# Altium footprint library 2.54插件排母.PcbLib: 74 footprints (part 2 of 5)
Each footprint in its own frame and in the unit in brackets; x right, y up, seen from the top. Pads: shape width x height; smd on the part's side, far side on the other; paste and mask are expansions set on the pad; w line width, h text height; cw(c..) or ccw(c..) is an arc to the next point about the centre after c.
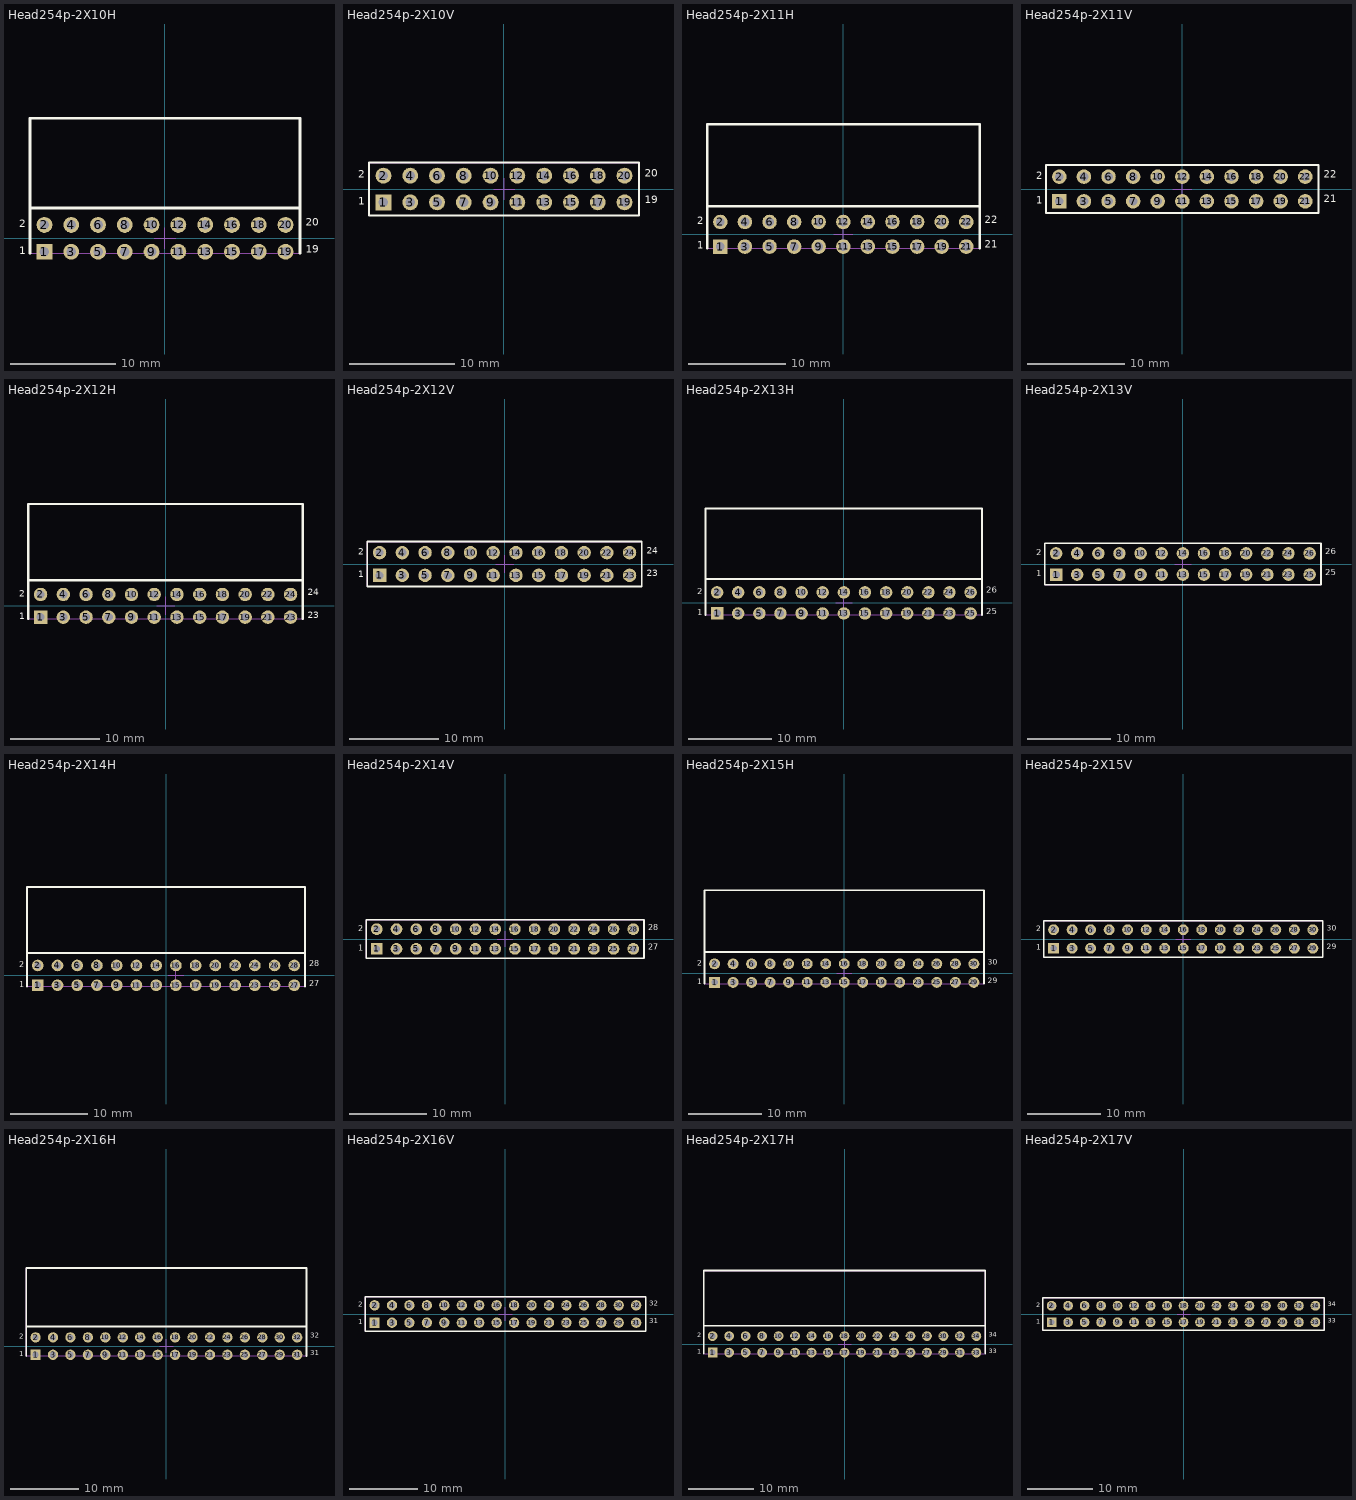
[diagram p1: the footprints below, top view; thin cyan lines are the x and y axes]

## Head254p-2X10H [mm] "2.54脚距 90度 插件 双排母"
height 5
pads (20):
  rect 1.5x1.5 hole 0.9: 1(-11.43,-1.27)
  round 1.5 hole 0.9: 2(-11.43,1.27) 3(-8.89,-1.27) 4(-8.89,1.27) 5(-6.35,-1.27) 6(-6.35,1.27) 7(-3.81,-1.27) 8(-3.81,1.27) 9(-1.27,-1.27) 10(-1.27,1.27) 11(1.27,-1.27) 12(1.27,1.27) 13(3.81,-1.27) 14(3.81,1.27) 15(6.35,-1.27) 16(6.35,1.27) 17(8.89,-1.27) 18(8.89,1.27) 19(11.43,-1.27) 20(11.43,1.27)
Top Overlay:
  lines w0.254: -12.8,-1.43 -12.8,11.37 12.8,11.37 12.8,-1.43 ; -12.8,2.87 12.8,2.87
  text "2" at -13.843,0.762 h1.27
  text "1" at -13.843,-1.778 h1.27
  text "19" at 13.335,-1.651 h1.27
  text "20" at 13.335,0.889 h1.27
Mechanical 13:
  lines w0.1: -12.8,-1.43 -12.8,11.37 12.8,11.37 12.8,-1.43 -12.8,-1.43
Mechanical 15:
  lines w0.1: -1,0 1,0 ; 0,-1 0,1
3D body: height 5.04, standoff -2.35, extent -12.8,-1.43 12.8,11.37

## Head254p-2X10V [mm] "2.54脚距 180度 插件 双排母"
height 9
pads (20):
  rect 1.5x1.5 hole 0.9: 1(-11.43,-1.27)
  round 1.5 hole 0.9: 2(-11.43,1.27) 3(-8.89,-1.27) 4(-8.89,1.27) 5(-6.35,-1.27) 6(-6.35,1.27) 7(-3.81,-1.27) 8(-3.81,1.27) 9(-1.27,-1.27) 10(-1.27,1.27) 11(1.27,-1.27) 12(1.27,1.27) 13(3.81,-1.27) 14(3.81,1.27) 15(6.35,-1.27) 16(6.35,1.27) 17(8.89,-1.27) 18(8.89,1.27) 19(11.43,-1.27) 20(11.43,1.27)
Top Overlay:
  lines w0.2: -12.8,-2.5 12.8,-2.5 12.8,2.5 -12.8,2.5 -12.8,-2.5
  text "2" at -13.843,0.762 h1.27
  text "1" at -13.843,-1.778 h1.27
  text "19" at 13.335,-1.651 h1.27
  text "20" at 13.335,0.889 h1.27
Mechanical 13:
  lines w0.1: -12.8,-2.5 -12.8,2.5 12.8,2.5 12.8,-2.5 -12.8,-2.5
Mechanical 15:
  lines w0.1: -0.973,0 1.027,0 ; 0.027,-1 0.027,1
3D body: height 8.5, standoff -3, extent -12.8,-2.5 12.8,2.5

## Head254p-2X11H [mm] "2.54脚距 90度 插件 双排母"
height 5
pads (22):
  rect 1.5x1.5 hole 0.9: 1(-12.7,-1.27)
  round 1.5 hole 0.9: 2(-12.7,1.27) 3(-10.16,-1.27) 4(-10.16,1.27) 5(-7.62,-1.27) 6(-7.62,1.27) 7(-5.08,-1.27) 8(-5.08,1.27) 9(-2.54,-1.27) 10(-2.54,1.27) 11(0,-1.27) 12(0,1.27) 13(2.54,-1.27) 14(2.54,1.27) 15(5.08,-1.27) 16(5.08,1.27) 17(7.62,-1.27) 18(7.62,1.27) 19(10.16,-1.27) 20(10.16,1.27) 21(12.7,-1.27) 22(12.7,1.27)
Top Overlay:
  lines w0.254: -14.07,-1.43 -14.07,11.37 14.07,11.37 14.07,-1.43 ; -14.07,2.87 14.07,2.87
  text "22" at 14.605,0.889 h1.27
  text "21" at 14.605,-1.651 h1.27
  text "1" at -15.113,-1.778 h1.27
  text "2" at -15.113,0.762 h1.27
Mechanical 13:
  lines w0.1: -14.07,-1.43 14.07,-1.43 14.07,11.37 -14.07,11.37 -14.07,-1.43
Mechanical 15:
  lines w0.1: -1,0 1,0 ; 0,-1 0,1
3D body: height 5.04, standoff -2.35, extent -14.07,-1.43 14.07,11.37

## Head254p-2X11V [mm] "2.54脚距 180度 插件 双排母"
height 9
pads (22):
  rect 1.5x1.5 hole 0.9: 1(-12.7,-1.27)
  round 1.5 hole 0.9: 2(-12.7,1.27) 3(-10.16,-1.27) 4(-10.16,1.27) 5(-7.62,-1.27) 6(-7.62,1.27) 7(-5.08,-1.27) 8(-5.08,1.27) 9(-2.54,-1.27) 10(-2.54,1.27) 11(0,-1.27) 12(0,1.27) 13(2.54,-1.27) 14(2.54,1.27) 15(5.08,-1.27) 16(5.08,1.27) 17(7.62,-1.27) 18(7.62,1.27) 19(10.16,-1.27) 20(10.16,1.27) 21(12.7,-1.27) 22(12.7,1.27)
Top Overlay:
  lines w0.2: -14.07,-2.5 14.07,-2.5 14.07,2.5 -14.07,2.5 -14.07,-2.5
  text "2" at -15.113,0.762 h1.27
  text "1" at -15.113,-1.778 h1.27
  text "21" at 14.605,-1.651 h1.27
  text "22" at 14.605,0.889 h1.27
Mechanical 13:
  lines w0.1: -14.07,-2.5 -14.07,2.5 14.07,2.5 14.07,-2.5 -14.07,-2.5
Mechanical 15:
  lines w0.1: -1,0 1,0 ; 0,-1 0,1
3D body: height 8.5, standoff -3, extent -14.07,-2.5 14.07,2.5

## Head254p-2X12H [mm] "2.54脚距 90度 插件 双排母"
height 5
pads (24):
  rect 1.5x1.5 hole 0.9: 1(-13.97,-1.27)
  round 1.5 hole 0.9: 2(-13.97,1.27) 3(-11.43,-1.27) 4(-11.43,1.27) 5(-8.89,-1.27) 6(-8.89,1.27) 7(-6.35,-1.27) 8(-6.35,1.27) 9(-3.81,-1.27) 10(-3.81,1.27) 11(-1.27,-1.27) 12(-1.27,1.27) 13(1.27,-1.27) 14(1.27,1.27) 15(3.81,-1.27) 16(3.81,1.27) 17(6.35,-1.27) 18(6.35,1.27) 19(8.89,-1.27) 20(8.89,1.27) 21(11.43,-1.27) 22(11.43,1.27) 23(13.97,-1.27) 24(13.97,1.27)
Top Overlay:
  lines w0.254: -15.34,-1.43 -15.34,11.37 15.34,11.37 15.34,-1.43 ; -15.34,2.87 15.34,2.87
  text "2" at -16.383,0.762 h1.27
  text "1" at -16.383,-1.778 h1.27
  text "23" at 15.875,-1.651 h1.27
  text "24" at 15.875,0.889 h1.27
Mechanical 13:
  lines w0.1: -15.34,-1.43 -15.34,11.37 15.34,11.37 15.34,-1.43 -15.34,-1.43
Mechanical 15:
  lines w0.1: -1,0 1,0 ; 0,-1 0,1
3D body: height 5.04, standoff -2.35, extent -15.34,-1.43 15.34,11.37

## Head254p-2X12V [mm] "2.54脚距 180度 插件 双排母"
height 9
pads (24):
  rect 1.5x1.5 hole 0.9: 1(-13.97,-1.27)
  round 1.5 hole 0.9: 2(-13.97,1.27) 3(-11.43,-1.27) 4(-11.43,1.27) 5(-8.89,-1.27) 6(-8.89,1.27) 7(-6.35,-1.27) 8(-6.35,1.27) 9(-3.81,-1.27) 10(-3.81,1.27) 11(-1.27,-1.27) 12(-1.27,1.27) 13(1.27,-1.27) 14(1.27,1.27) 15(3.81,-1.27) 16(3.81,1.27) 17(6.35,-1.27) 18(6.35,1.27) 19(8.89,-1.27) 20(8.89,1.27) 21(11.43,-1.27) 22(11.43,1.27) 23(13.97,-1.27) 24(13.97,1.27)
Top Overlay:
  lines w0.2: -15.34,-2.5 15.34,-2.5 15.34,2.5 -15.34,2.5 -15.34,-2.5
  text "2" at -16.383,0.762 h1.27
  text "1" at -16.383,-1.778 h1.27
  text "23" at 15.875,-1.651 h1.27
  text "24" at 15.875,0.889 h1.27
Mechanical 13:
  lines w0.1: -15.34,-2.5 -15.34,2.5 15.34,2.5 15.34,-2.5 -15.34,-2.5
Mechanical 15:
  lines w0.1: -1,0 1,0 ; 0,-1 0,1
3D body: height 8.5, standoff -3, extent -15.34,-2.5 15.34,2.5

## Head254p-2X13H [mm] "2.54脚距 90度 插件 双排母"
height 5
pads (26):
  rect 1.5x1.5 hole 0.9: 1(-15.24,-1.27)
  round 1.5 hole 0.9: 2(-15.24,1.27) 3(-12.7,-1.27) 4(-12.7,1.27) 5(-10.16,-1.27) 6(-10.16,1.27) 7(-7.62,-1.27) 8(-7.62,1.27) 9(-5.08,-1.27) 10(-5.08,1.27) 11(-2.54,-1.27) 12(-2.54,1.27) 13(0,-1.27) 14(0,1.27) 15(2.54,-1.27) 16(2.54,1.27) 17(5.08,-1.27) 18(5.08,1.27) 19(7.62,-1.27) 20(7.62,1.27) 21(10.16,-1.27) 22(10.16,1.27) 23(12.7,-1.27) 24(12.7,1.27) 25(15.24,-1.27) 26(15.24,1.27)
Top Overlay:
  lines w0.254: -16.61,-1.43 -16.61,11.37 16.61,11.37 16.61,-1.43 ; -16.61,2.87 16.61,2.87
  text "26" at 17.145,0.889 h1.27
  text "25" at 17.145,-1.651 h1.27
  text "1" at -17.653,-1.778 h1.27
  text "2" at -17.653,0.762 h1.27
Mechanical 13:
  lines w0.1: -16.61,-1.43 16.61,-1.43 16.61,11.37 -16.61,11.37 -16.61,-1.43
Mechanical 15:
  lines w0.1: -1,0 1,0 ; 0,-1 0,1
3D body: height 5.04, standoff -2.35, extent -16.61,-1.43 16.61,11.37

## Head254p-2X13V [mm] "2.54脚距 180度 插件 双排母"
height 9
pads (26):
  rect 1.5x1.5 hole 0.9: 1(-15.24,-1.27)
  round 1.5 hole 0.9: 2(-15.24,1.27) 3(-12.7,-1.27) 4(-12.7,1.27) 5(-10.16,-1.27) 6(-10.16,1.27) 7(-7.62,-1.27) 8(-7.62,1.27) 9(-5.08,-1.27) 10(-5.08,1.27) 11(-2.54,-1.27) 12(-2.54,1.27) 13(0,-1.27) 14(0,1.27) 15(2.54,-1.27) 16(2.54,1.27) 17(5.08,-1.27) 18(5.08,1.27) 19(7.62,-1.27) 20(7.62,1.27) 21(10.16,-1.27) 22(10.16,1.27) 23(12.7,-1.27) 24(12.7,1.27) 25(15.24,-1.27) 26(15.24,1.27)
Top Overlay:
  lines w0.2: -16.61,-2.5 16.61,-2.5 16.61,2.5 -16.61,2.5 -16.61,-2.5
  text "2" at -17.653,0.762 h1.27
  text "1" at -17.653,-1.778 h1.27
  text "25" at 17.145,-1.651 h1.27
  text "26" at 17.145,0.889 h1.27
Mechanical 13:
  lines w0.1: -16.61,-2.5 -16.61,2.5 16.61,2.5 16.61,-2.5 -16.61,-2.5
Mechanical 15:
  lines w0.1: -1,0 1,0 ; 0,-1 0,1
3D body: height 8.5, standoff -3, extent -16.61,-2.5 16.61,2.5

## Head254p-2X14H [mm] "2.54脚距 90度 插件 双排母"
height 5
pads (28):
  rect 1.5x1.5 hole 0.9: 1(-16.51,-1.27)
  round 1.5 hole 0.9: 2(-16.51,1.27) 3(-13.97,-1.27) 4(-13.97,1.27) 5(-11.43,-1.27) 6(-11.43,1.27) 7(-8.89,-1.27) 8(-8.89,1.27) 9(-6.35,-1.27) 10(-6.35,1.27) 11(-3.81,-1.27) 12(-3.81,1.27) 13(-1.27,-1.27) 14(-1.27,1.27) 15(1.27,-1.27) 16(1.27,1.27) 17(3.81,-1.27) 18(3.81,1.27) 19(6.35,-1.27) 20(6.35,1.27) 21(8.89,-1.27) 22(8.89,1.27) 23(11.43,-1.27) 24(11.43,1.27) 25(13.97,-1.27) 26(13.97,1.27) 27(16.51,-1.27) 28(16.51,1.27)
Top Overlay:
  lines w0.254: -17.88,-1.43 -17.88,11.37 17.88,11.37 17.88,-1.43 ; -17.88,2.87 17.88,2.87
  text "28" at 18.415,0.889 h1.27
  text "27" at 18.415,-1.651 h1.27
  text "1" at -18.923,-1.778 h1.27
  text "2" at -18.923,0.762 h1.27
Mechanical 13:
  lines w0.1: -17.88,-1.43 17.88,-1.43 17.88,11.37 -17.88,11.37 -17.88,-1.43
Mechanical 15:
  lines w0.1: 0.27,0 2.27,0 ; 1.27,-1 1.27,1
3D body: height 5.04, standoff -2.35, extent -17.88,-1.43 17.88,11.37

## Head254p-2X14V [mm] "2.54脚距 180度 插件 双排母"
height 9
pads (28):
  rect 1.5x1.5 hole 0.9: 1(-16.51,-1.27)
  round 1.5 hole 0.9: 2(-16.51,1.27) 3(-13.97,-1.27) 4(-13.97,1.27) 5(-11.43,-1.27) 6(-11.43,1.27) 7(-8.89,-1.27) 8(-8.89,1.27) 9(-6.35,-1.27) 10(-6.35,1.27) 11(-3.81,-1.27) 12(-3.81,1.27) 13(-1.27,-1.27) 14(-1.27,1.27) 15(1.27,-1.27) 16(1.27,1.27) 17(3.81,-1.27) 18(3.81,1.27) 19(6.35,-1.27) 20(6.35,1.27) 21(8.89,-1.27) 22(8.89,1.27) 23(11.43,-1.27) 24(11.43,1.27) 25(13.97,-1.27) 26(13.97,1.27) 27(16.51,-1.27) 28(16.51,1.27)
Top Overlay:
  lines w0.2: -17.88,-2.5 17.88,-2.5 17.88,2.5 -17.88,2.5 -17.88,-2.5
  text "2" at -18.923,0.762 h1.27
  text "1" at -18.923,-1.778 h1.27
  text "27" at 18.415,-1.651 h1.27
  text "28" at 18.415,0.889 h1.27
Mechanical 13:
  lines w0.1: -17.88,-2.5 -17.88,2.5 17.88,2.5 17.88,-2.5 -17.88,-2.5
Mechanical 15:
  lines w0.1: -1,0 1,0 ; 0,-1 0,1
3D body: height 8.5, standoff -3, extent -17.88,-2.5 17.88,2.5

## Head254p-2X15H [mm] "2.54脚距 90度 插件 双排母"
height 5
pads (30):
  rect 1.5x1.5 hole 0.9: 1(-17.78,-1.27)
  round 1.5 hole 0.9: 2(-17.78,1.27) 3(-15.24,-1.27) 4(-15.24,1.27) 5(-12.7,-1.27) 6(-12.7,1.27) 7(-10.16,-1.27) 8(-10.16,1.27) 9(-7.62,-1.27) 10(-7.62,1.27) 11(-5.08,-1.27) 12(-5.08,1.27) 13(-2.54,-1.27) 14(-2.54,1.27) 15(0,-1.27) 16(0,1.27) 17(2.54,-1.27) 18(2.54,1.27) 19(5.08,-1.27) 20(5.08,1.27) 21(7.62,-1.27) 22(7.62,1.27) 23(10.16,-1.27) 24(10.16,1.27) 25(12.7,-1.27) 26(12.7,1.27) 27(15.24,-1.27) 28(15.24,1.27) 29(17.78,-1.27) 30(17.78,1.27)
Top Overlay:
  lines w0.254: -19.15,-1.43 -19.15,11.37 19.15,11.37 19.15,-1.43 ; -19.15,2.87 19.15,2.87
  text "30" at 19.685,0.889 h1.27
  text "29" at 19.685,-1.651 h1.27
  text "1" at -20.193,-1.778 h1.27
  text "2" at -20.193,0.762 h1.27
Mechanical 13:
  lines w0.1: -19.15,-1.43 19.15,-1.43 19.15,11.37 -19.15,11.37 -19.15,-1.43
Mechanical 15:
  lines w0.1: -1,0 1,0 ; 0,-1 0,1
3D body: height 5.04, standoff -2.35, extent -19.15,-1.43 19.15,11.37

## Head254p-2X15V [mm] "2.54脚距 180度 插件 双排母"
height 9
pads (30):
  rect 1.5x1.5 hole 0.9: 1(-17.78,-1.27)
  round 1.5 hole 0.9: 2(-17.78,1.27) 3(-15.24,-1.27) 4(-15.24,1.27) 5(-12.7,-1.27) 6(-12.7,1.27) 7(-10.16,-1.27) 8(-10.16,1.27) 9(-7.62,-1.27) 10(-7.62,1.27) 11(-5.08,-1.27) 12(-5.08,1.27) 13(-2.54,-1.27) 14(-2.54,1.27) 15(0,-1.27) 16(0,1.27) 17(2.54,-1.27) 18(2.54,1.27) 19(5.08,-1.27) 20(5.08,1.27) 21(7.62,-1.27) 22(7.62,1.27) 23(10.16,-1.27) 24(10.16,1.27) 25(12.7,-1.27) 26(12.7,1.27) 27(15.24,-1.27) 28(15.24,1.27) 29(17.78,-1.27) 30(17.78,1.27)
Top Overlay:
  lines w0.2: -19.15,-2.5 -19.15,2.5 19.15,2.5 19.15,-2.5 -19.15,-2.5
  text "30" at 19.685,0.889 h1.27
  text "29" at 19.685,-1.651 h1.27
  text "1" at -20.193,-1.778 h1.27
  text "2" at -20.193,0.762 h1.27
Mechanical 13:
  lines w0.1: -19.15,-2.5 19.15,-2.5 19.15,2.5 -19.15,2.5 -19.15,-2.5
Mechanical 15:
  lines w0.1: -1,0 1,0 ; 0,-1 0,1
3D body: height 8.5, standoff -3, extent -19.15,-2.5 19.15,2.5

## Head254p-2X16H [mm] "2.54脚距 90度 插件 双排母"
height 5
pads (32):
  rect 1.5x1.5 hole 0.9: 1(-19.05,-1.27)
  round 1.5 hole 0.9: 2(-19.05,1.27) 3(-16.51,-1.27) 4(-16.51,1.27) 5(-13.97,-1.27) 6(-13.97,1.27) 7(-11.43,-1.27) 8(-11.43,1.27) 9(-8.89,-1.27) 10(-8.89,1.27) 11(-6.35,-1.27) 12(-6.35,1.27) 13(-3.81,-1.27) 14(-3.81,1.27) 15(-1.27,-1.27) 16(-1.27,1.27) 17(1.27,-1.27) 18(1.27,1.27) 19(3.81,-1.27) 20(3.81,1.27) 21(6.35,-1.27) 22(6.35,1.27) 23(8.89,-1.27) 24(8.89,1.27) 25(11.43,-1.27) 26(11.43,1.27) 27(13.97,-1.27) 28(13.97,1.27) 29(16.51,-1.27) 30(16.51,1.27) 31(19.05,-1.27) 32(19.05,1.27)
Top Overlay:
  lines w0.254: -20.42,-1.43 -20.42,11.37 20.42,11.37 20.42,-1.43 ; -20.42,2.87 20.42,2.87
  text "32" at 20.955,0.889 h1.27
  text "31" at 20.955,-1.651 h1.27
  text "1" at -21.463,-1.778 h1.27
  text "2" at -21.463,0.762 h1.27
Mechanical 13:
  lines w0.1: -20.42,-1.43 20.42,-1.43 20.42,11.37 -20.42,11.37 -20.42,-1.43
Mechanical 15:
  lines w0.1: -1,0 1,0 ; 0,-1 0,1
3D body: height 5.04, standoff -2.35, extent -20.42,-1.43 20.42,11.37

## Head254p-2X16V [mm] "2.54脚距 180度 插件 双排母"
height 9
pads (32):
  rect 1.5x1.5 hole 0.9: 1(-19.05,-1.27)
  round 1.5 hole 0.9: 2(-19.05,1.27) 3(-16.51,-1.27) 4(-16.51,1.27) 5(-13.97,-1.27) 6(-13.97,1.27) 7(-11.43,-1.27) 8(-11.43,1.27) 9(-8.89,-1.27) 10(-8.89,1.27) 11(-6.35,-1.27) 12(-6.35,1.27) 13(-3.81,-1.27) 14(-3.81,1.27) 15(-1.27,-1.27) 16(-1.27,1.27) 17(1.27,-1.27) 18(1.27,1.27) 19(3.81,-1.27) 20(3.81,1.27) 21(6.35,-1.27) 22(6.35,1.27) 23(8.89,-1.27) 24(8.89,1.27) 25(11.43,-1.27) 26(11.43,1.27) 27(13.97,-1.27) 28(13.97,1.27) 29(16.51,-1.27) 30(16.51,1.27) 31(19.05,-1.27) 32(19.05,1.27)
Top Overlay:
  lines w0.2: -20.42,-2.5 20.42,-2.5 20.42,2.5 -20.42,2.5 -20.42,-2.5
  text "2" at -21.463,0.762 h1.27
  text "1" at -21.463,-1.778 h1.27
  text "31" at 20.955,-1.651 h1.27
  text "32" at 20.955,0.889 h1.27
Mechanical 13:
  lines w0.1: -20.42,-2.5 -20.42,2.5 20.42,2.5 20.42,-2.5 -20.42,-2.5
Mechanical 15:
  lines w0.1: -1,0 1,0 ; 0,-1 0,1
3D body: height 8.5, standoff -3, extent -20.42,-2.5 20.42,2.5

## Head254p-2X17H [mm] "2.54脚距 90度 插件 双排母"
height 5
pads (34):
  rect 1.5x1.5 hole 0.9: 1(-20.32,-1.27)
  round 1.5 hole 0.9: 2(-20.32,1.27) 3(-17.78,-1.27) 4(-17.78,1.27) 5(-15.24,-1.27) 6(-15.24,1.27) 7(-12.7,-1.27) 8(-12.7,1.27) 9(-10.16,-1.27) 10(-10.16,1.27) 11(-7.62,-1.27) 12(-7.62,1.27) 13(-5.08,-1.27) 14(-5.08,1.27) 15(-2.54,-1.27) 16(-2.54,1.27) 17(0,-1.27) 18(0,1.27) 19(2.54,-1.27) 20(2.54,1.27) 21(5.08,-1.27) 22(5.08,1.27) 23(7.62,-1.27) 24(7.62,1.27) 25(10.16,-1.27) 26(10.16,1.27) 27(12.7,-1.27) 28(12.7,1.27) 29(15.24,-1.27) 30(15.24,1.27) 31(17.78,-1.27) 32(17.78,1.27) 33(20.32,-1.27) 34(20.32,1.27)
Top Overlay:
  lines w0.254: -21.69,-1.43 -21.69,11.37 21.69,11.37 21.69,-1.43 ; -21.69,2.87 21.69,2.87
  text "34" at 22.225,0.889 h1.27
  text "33" at 22.225,-1.651 h1.27
  text "1" at -22.733,-1.778 h1.27
  text "2" at -22.733,0.762 h1.27
Mechanical 13:
  lines w0.1: -21.69,-1.43 21.69,-1.43 21.69,11.37 -21.69,11.37 -21.69,-1.43
Mechanical 15:
  lines w0.1: -1,0 1,0 ; 0,-1 0,1
3D body: height 5.04, standoff -2.35, extent -21.69,-1.43 21.69,11.37

## Head254p-2X17V [mm] "2.54脚距 180度 插件 双排母"
height 9
pads (34):
  rect 1.5x1.5 hole 0.9: 1(-20.32,-1.27)
  round 1.5 hole 0.9: 2(-20.32,1.27) 3(-17.78,-1.27) 4(-17.78,1.27) 5(-15.24,-1.27) 6(-15.24,1.27) 7(-12.7,-1.27) 8(-12.7,1.27) 9(-10.16,-1.27) 10(-10.16,1.27) 11(-7.62,-1.27) 12(-7.62,1.27) 13(-5.08,-1.27) 14(-5.08,1.27) 15(-2.54,-1.27) 16(-2.54,1.27) 17(0,-1.27) 18(0,1.27) 19(2.54,-1.27) 20(2.54,1.27) 21(5.08,-1.27) 22(5.08,1.27) 23(7.62,-1.27) 24(7.62,1.27) 25(10.16,-1.27) 26(10.16,1.27) 27(12.7,-1.27) 28(12.7,1.27) 29(15.24,-1.27) 30(15.24,1.27) 31(17.78,-1.27) 32(17.78,1.27) 33(20.32,-1.27) 34(20.32,1.27)
Top Overlay:
  lines w0.2: -21.69,-2.5 21.69,-2.5 21.69,2.5 -21.69,2.5 -21.69,-2.5
  text "2" at -22.733,0.762 h1.27
  text "1" at -22.733,-1.778 h1.27
  text "33" at 22.225,-1.651 h1.27
  text "34" at 22.225,0.889 h1.27
Mechanical 13:
  lines w0.1: -21.69,-2.5 -21.69,2.5 21.69,2.5 21.69,-2.5 -21.69,-2.5
Mechanical 15:
  lines w0.1: -1,0 1,0 ; 0,-1 0,1
3D body: height 8.5, standoff -3, extent -21.69,-2.5 21.69,2.5